# Altium footprint library mainLib.PcbLib: 169 footprints (part 2 of 11)
Each footprint in its own frame and in the unit in brackets; x right, y up, seen from the top. Pads: shape width x height; smd on the part's side, far side on the other; paste and mask are expansions set on the pad; w line width, h text height; cw(c..) or ccw(c..) is an arc to the next point about the centre after c.
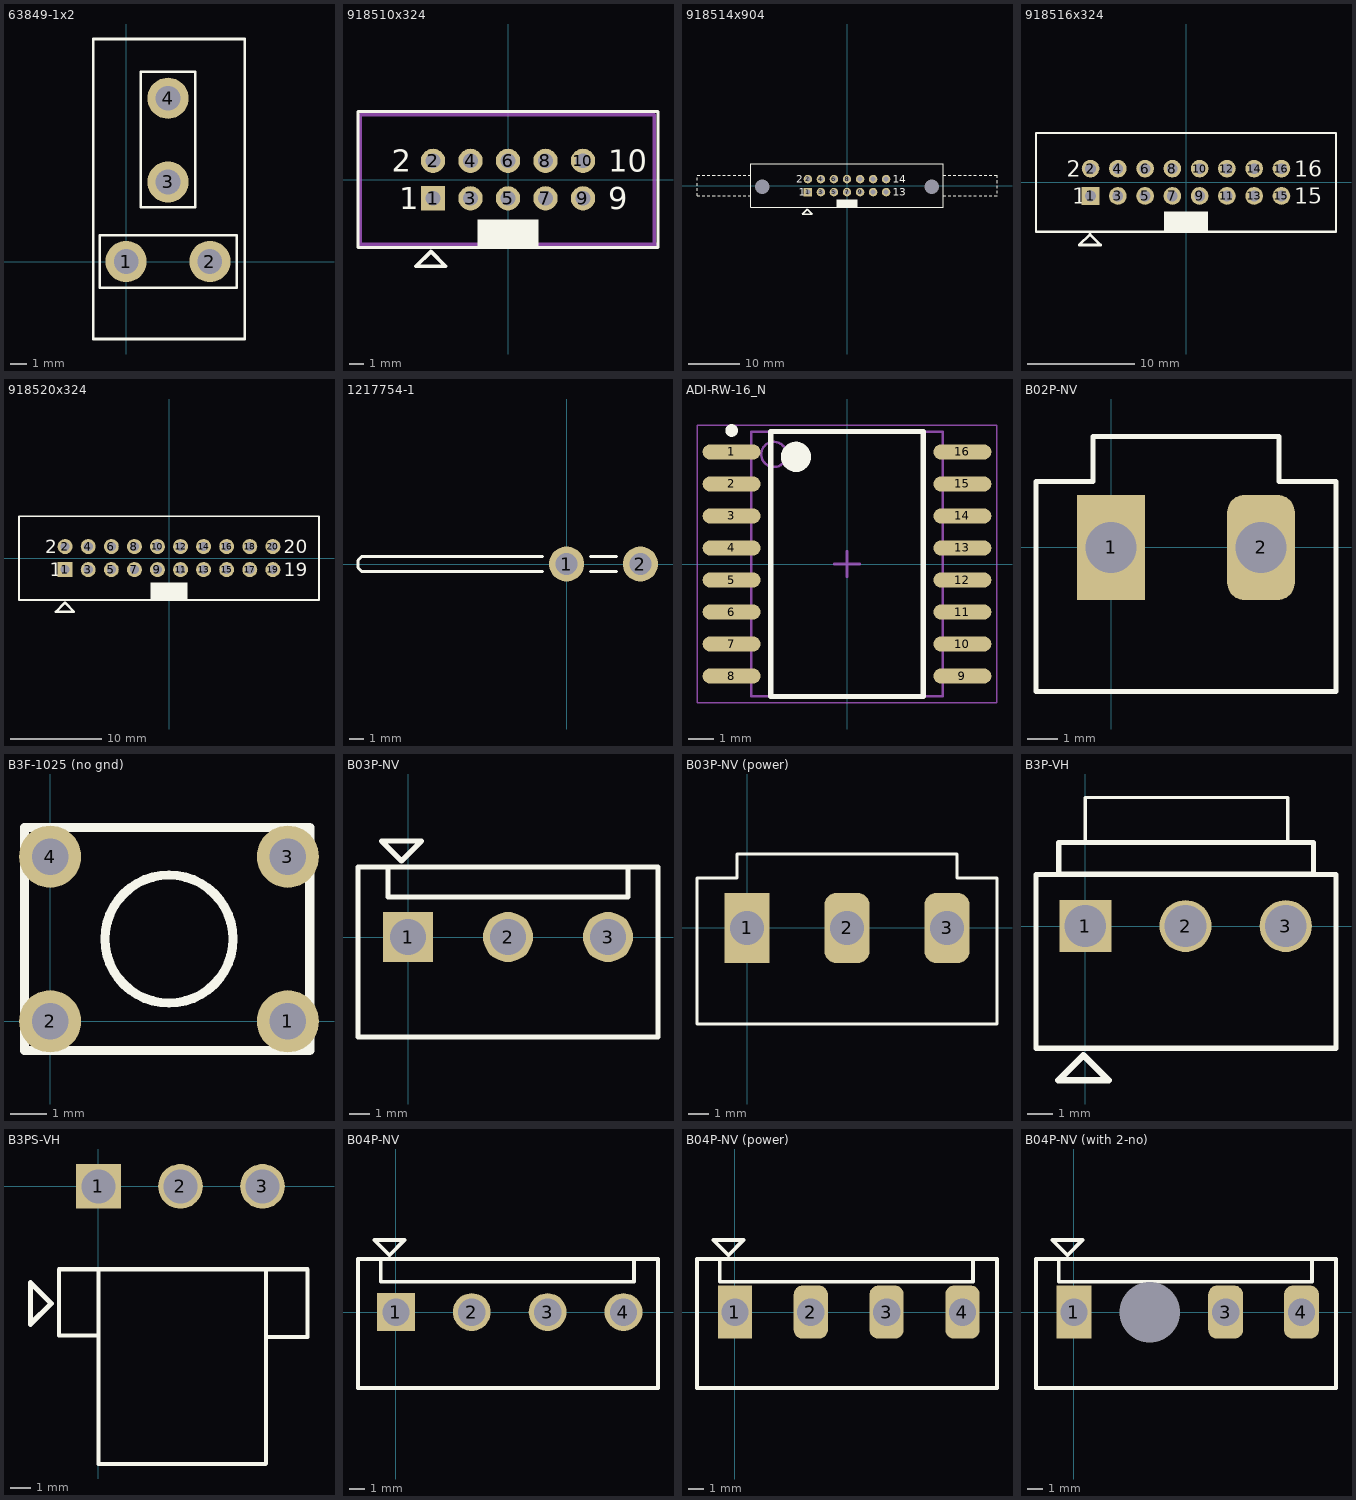
[diagram p1: the footprints below, top view; thin cyan lines are the x and y axes]

## 63849-1x2 [mm]
pads (4):
  round 2.5 hole 1.5: 1(0,0) 2(5.08,0) 3(2.54,4.826) 4(2.54,9.906)
Top Overlay:
  lines w0.152: -2,-4.7 7.2,-4.7 7.2,13.5 -2,13.5 -2,-4.7 ; -1.6,-1.6 -1.6,1.6 6.7,1.6 6.7,-1.6 -1.6,-1.6 ; 0.9,3.3 0.9,11.5 4.2,11.5 4.2,3.3 0.9,3.3
3D body "c-154717-3-at-3d.stp": height 23.31, standoff 1.07, extent -1.143,-2.555 6.222,3.195
3D body "c-154717-3-at-3d.stp": height 23.31, standoff 1.07, extent -0.655,3.654 5.095,11.019
3D body "c-63849-1-k-3d.stp": height 10.22, standoff -3.8, extent -1.422,-1.543 6.503,1.543
3D body "c-63849-1-k-3d.stp": height 10.21, standoff -3.81, extent 0.997,3.404 4.083,11.328
3D body "c-0926522-02-r-3d.stp": height 25.03, standoff 0.9, extent -1.96,-4.705 7.19,13.445

## 918510x324 [mm] "Connector; IDC, Low Profile Male Header, Thru-Hole; 10 Position; Vertical; Pitch 2.54 mm; Body 20.32 x 9.2 x 9.45 mm (LxWxH)"
height 9.45
pads (10):
  rect 1.65x1.65 hole 1: 1(-5.08,-1.27)
  round 1.65 hole 1: 2(-5.08,1.27) 3(-2.54,-1.27) 4(-2.54,1.27) 5(0,-1.27) 6(0,1.27) 7(2.54,-1.27) 8(2.54,1.27) 9(5.08,-1.27) 10(5.08,1.27)
Top Overlay:
  rectangle: -2.05,-4.6 2.05,-2.7
  lines w0.2: -10.16,-4.6 -10.16,4.6 10.16,4.6 10.16,-4.6 -10.16,-4.6
  lines w0.254: -6.225,-5.875 -4.225,-5.875 -5.225,-4.875 -6.225,-5.875
  text "2" at -7.88,0.52 h1.5
  text "1" at -7.38,-2.02 h1.5
  text "10" at 6.78,0.52 h1.5
  text "9" at 6.78,-2.02 h1.5
Mechanical 13:
  lines w0.254: -10,-4.4 -10,4.4 9.9,4.4 9.9,-4.3 10,-4.4 -10,-4.4 ; -10,-4.4 -10,-4.4
3D body "User Library-BH-10___64.step": height 8.84, standoff -3.3, extent -10.18,-4.5 10.18,4.7

## 918514x904 [mm] "Connector; IDC, Thru-Hole; 14 Position; Vertical; Pitch 2.54 mm; Body 37.40 x 8.5 x 25.75 mm (LxWxH), Locking levers"
height 25.75
pads (16):
  rect 1.65x1.65 hole 1: 1(-7.62,-1.27)
  round 1.65 hole 1: 2(-7.62,1.27) 3(-5.08,-1.27) 4(-5.08,1.27) 5(-2.54,-1.27) 6(-2.54,1.27) 7(0,-1.27) 8(0,1.27) 9(2.54,-1.27) 10(2.54,1.27) 11(5.08,-1.27) 12(5.08,1.27) 13(7.62,-1.27) 14(7.62,1.27)
  round 2.5 hole 2.8 unplated: MH1(-16.51,-0.25) MH2(16.51,-0.25)
Top Overlay:
  rectangle: -2.05,-4.25 2.05,-2.7
  lines w0.2: -29.2,-1 -29.2,-0.5 ; -29.2,0 -29.2,0.5 ; -29.2,1 -29.2,1.5 ; -29.2,2 -28.69,2 ; -29.19,-1.5 -29.2,-2 -28.69,-2 ; -28.19,-2 -27.69,-2 ; -28.19,2 -27.69,2 ; -27.19,-2 -26.69,-2 ; -27.19,2 -26.69,2 ; -26.19,-2 -25.69,-2 ; -26.19,2 -25.69,2 ; -25.19,-2 -24.69,-2 ; -25.19,2 -24.69,2 ; -24.19,-2 -23.69,-2 ; -24.19,2 -23.69,2 ; -23.19,-2 -22.69,-2 ; -23.19,2 -22.69,2 ; -22.19,-2 -21.69,-2 ; -22.19,2 -21.69,2 ; -21.19,-2 -20.69,-2 ; -21.19,2 -20.69,2 ; -20.19,-2 -19.69,-2 ; -20.19,2 -19.69,2 ; -19.19,-2 -18.7,-2 ; -19.19,2 -18.7,2 ; 18.7,-2 19.2,-2 ; 18.7,2 19.2,2 ; 19.7,-2 20.2,-2 ; 19.7,2 20.2,2 ; 20.7,-2 21.2,-2 ; 20.7,2 21.2,2 ; 21.7,-2 22.2,-2 ; 21.7,2 22.2,2 ; 22.7,-2 23.2,-2 ; 22.7,2 23.2,2 ; 23.7,-2 24.2,-2 ; 23.7,2 24.2,2 ; 24.7,-2 25.2,-2 ; 24.7,2 25.2,2 ; 25.7,-2 26.2,-2 ; 25.7,2 26.2,2 ; 26.7,-2 27.2,-2 ; 26.7,2 27.2,2 ; 27.7,-2 28.2,-2 ; 27.7,2 28.2,2 ; 28.7,-2 29.2,-2 ; 28.7,2 29.2,2 29.2,1.5 ; 29.2,-1.5 29.2,-1 ; 29.2,-0.5 29.2,0 ; 29.2,0.5 29.2,1 ; -18.7,-4.25 -18.7,4.25 18.7,4.25 18.7,-4.25 -18.7,-4.25
  lines w0.254: -8.75,-5.575 -7.75,-4.575 -6.75,-5.575 -8.75,-5.575
  text "2" at -9.9,0.52 h1.5
  text "1" at -9.4,-2.02 h1.5
  text "14" at 8.9,0.52 h1.5
  text "13" at 8.9,-2.02 h1.5
3D body "091X514X904_100081391MOD000B.STP": height 25.8, standoff -2.85, extent -18.721,-4.258 18.679,4.242

## 918516x324 [mm] "Connector; IDC, Low Profile Male Header, Thru-Hole; 16 Position; Vertical; Pitch 2.54 mm; Body 27.94 x 9.2 x 9.45 mm (LxWxH)"
height 9.45
pads (16):
  rect 1.65x1.65 hole 1: 1(-8.89,-1.27)
  round 1.65 hole 1: 2(-8.89,1.27) 3(-6.35,-1.27) 4(-6.35,1.27) 5(-3.81,-1.27) 6(-3.81,1.27) 7(-1.27,-1.27) 8(-1.27,1.27) 9(1.27,-1.27) 10(1.27,1.27) 11(3.81,-1.27) 12(3.81,1.27) 13(6.35,-1.27) 14(6.35,1.27) 15(8.89,-1.27) 16(8.89,1.27)
Top Overlay:
  rectangle: -2.05,-4.6 2.05,-2.7
  lines w0.2: -13.97,-4.6 13.97,-4.6 13.97,4.6 -13.97,4.6 -13.97,-4.6
  lines w0.254: -9.95,-5.85 -8.95,-4.85 -7.95,-5.85 -9.95,-5.85
  text "15" at 10.09,-2.02 h1.5
  text "16" at 10.09,0.52 h1.5
  text "1" at -10.59,-2.02 h1.5
  text "2" at -11.09,0.52 h1.5
3D body "091X516X324_100081396MOD000B.STP": height 9.46, standoff -2.89, extent -13.95,-4.45 13.95,4.75

## 918520x324 [mm] "Connector; IDC, Low Profile Male Header, Thru-Hole; 20 Position; Vertical; Pitch 2.54 mm; Body 33.02 x 9.2 x 9.45 mm (LxWxH)"
height 9.45
pads (20):
  rect 1.65x1.65 hole 1: 1(-11.43,-1.27)
  round 1.65 hole 1: 2(-11.43,1.27) 3(-8.89,-1.27) 4(-8.89,1.27) 5(-6.35,-1.27) 6(-6.35,1.27) 7(-3.81,-1.27) 8(-3.81,1.27) 9(-1.27,-1.27) 10(-1.27,1.27) 11(1.27,-1.27) 12(1.27,1.27) 13(3.81,-1.27) 14(3.81,1.27) 15(6.35,-1.27) 16(6.35,1.27) 17(8.89,-1.27) 18(8.89,1.27) 19(11.43,-1.27) 20(11.43,1.27)
Top Overlay:
  rectangle: -2.05,-4.6 2.05,-2.7
  lines w0.2: -16.51,-4.6 16.51,-4.6 16.51,4.6 -16.51,4.6 -16.51,-4.6
  lines w0.254: -12.45,-5.9 -11.45,-4.9 -10.45,-5.9 -12.45,-5.9
  text "19" at 12.63,-2.02 h1.5
  text "20" at 12.63,0.52 h1.5
  text "1" at -13.13,-2.02 h1.5
  text "2" at -13.63,0.52 h1.5
3D body "0918_SEK_low_profile_male_header_straight_20-pin_2_9_PCB.stp": height 9.47, standoff -3.18, extent -16.51,-4.45 16.51,4.75

## 1217754-1 [mil]
pads (2):
  round 95 hole 60: 1(0,0) 2(200,0)
Top Overlay:
  lines w8: -65,-20 -555,-20 -565,-10 -565,10 -555,20 -65,20 ; 65,-20 135,-20 ; 65,20 135,20
3D body "c-1217754-1-d-3d.stp": height 351, standoff -149, extent -569,-15.5 231,16

## ADI-RW-16_N [mm] "SOIC, 16-Leads, Body 10.3x7.5mm, Pitch 1.27mm, IPC Medium Density"
height 2.65
pads (16):
  oval 2.3x0.6 smd: 1(-4.575,4.445) 2(-4.575,3.175) 3(-4.575,1.905) 4(-4.575,0.635) 5(-4.575,-0.635) 6(-4.575,-1.905) 7(-4.575,-3.175) 8(-4.575,-4.445) 9(4.575,-4.445) 10(4.575,-3.175) 11(4.575,-1.905) 12(4.575,-0.635) 13(4.575,0.635) 14(4.575,1.905) 15(4.575,3.175) 16(4.575,4.445)
Top Overlay:
  circle w0.25: c-4.575,5.295 r0.125
  circle w0.6: c-2.025,4.25 r0.3
  lines w0.2: -3.025,-5.25 -3.025,5.25 3.025,5.25 3.025,-5.25 -3.025,-5.25
Mechanical 13:
  circle w0.1: c-2.9,4.35 r0.5
  lines w0.1: -3.8,-5.25 -3.8,5.25 3.8,5.25 3.8,-5.25 -3.8,-5.25
Mechanical 15:
  lines w0.05: -5.95,-5.5 -5.95,5.5 5.95,5.5 5.95,-5.5 -5.95,-5.5
  lines w0.1: -0.5,0 0.5,0 ; 0,-0.5 0,0.5
3D body "User Library-SOIC16_Wide_JEDEC_MS-013AA.step": height 2.62, standoff -0.03, extent -5.315,-5.25 5.315,5.25

## B02P-NV [mm]
pads (2):
  rect 2.25x3.5 hole 1.7: 1(0,0)
  rrect50% 2.25x3.5 hole 1.7: 2(5,0)
Top Overlay:
  lines w0.152: -2.5,-4.8 -2.5,2.2 -0.6,2.2 -0.6,3.7 5.6,3.7 5.6,2.2 7.5,2.2 7.5,-4.8 -2.5,-4.8
3D body "B02P-NV.STEP": height 10.92, standoff -3.68, extent -2.5,-4.8 7.5,3.7

## B3F-1025 (no gnd) [mm]
pads (4):
  round 1.7 hole 1: 1(6.5,0) 2(0,0) 3(6.5,4.5) 4(0,4.5)
Top Overlay:
  circle w0.254: c3.25,2.25 r1.75
  lines w0.254: -0.7,-0.8 7.1,-0.8 7.1,5.3 -0.7,5.3 -0.7,-0.8
3D body "b3f-1025.stp": height 5.01, standoff -3.49, extent -0.6,-0.75 7.1,5.25

## B03P-NV [mm]
pads (3):
  rect 2.5x2.5 hole 1.8: 1(0,0)
  round 2.5 hole 1.8: 2(5,0) 3(10,0)
Top Overlay:
  lines w0.254: -1,3.5 -1,2 11,2 11,3.5 ; -2.5,-5 -2.5,3.5 12.5,3.5 12.5,-5 -2.5,-5 ; -1.325,4.8 -0.325,3.8 0.675,4.8 -1.325,4.8
3D body "B03P-NV.STEP": height 10.9, standoff -3.7, extent -2.525,-4.825 12.475,3.675

## B03P-NV (power) [mm]
pads (3):
  rect 2.25x3.5 hole 1.7: 1(0,0)
  rrect50% 2.25x3.5 hole 1.7: 2(5,0) 3(10,0)
Top Overlay:
  lines w0.152: -2.5,-4.8 12.5,-4.8 12.5,2.5 10.5,2.5 10.5,3.7 -0.5,3.7 -0.5,2.5 -2.5,2.5 -2.5,-4.8
3D body "B03P-NV.STEP": height 2.1, standoff -12.5, extent -2.5,-4.8 12.5,3.7

## B3P-VH [mm]
pads (3):
  rect 2.057x2.057 / inner round 0 / far side round 2.057 hole 1.65 mask+0.128: 1(0,0)
  round 2.057 / inner round 0 / far side round 2.057 hole 1.65 mask+0.128: 2(3.96,0) 3(7.92,0)
Top Overlay:
  lines w0.127: 0,3.302 8.001,3.302 8.001,5.08 0,5.08 0,3.302
  lines w0.203: -1.95,-4.826 -1.95,2.032 9.906,2.032 9.906,-4.826 -1.95,-4.826 ; -1.05,2.05 9.017,2.05 9.017,3.302 -1.05,3.302 -1.05,2.05
  lines w0.254: -1.075,-6.1 -0.075,-5.1 0.925,-6.1 -1.075,-6.1
3D body "B3P-VH.STEP": height 10.93, standoff -3.67, extent -1.947,-4.783 9.873,3.717

## B3PS-VH [mm]
pads (3):
  rect 2.158x2.158 / inner round 0 / far side rect 2.158x2.158 hole 1.65 mask+0.128: 1(0,0)
  round 2.158 / inner round 0 / far side round 2.158 hole 1.65 mask+0.128: 2(3.96,0) 3(7.92,0)
Top Overlay:
  lines w0.203: 0,-7.2 -1.9,-7.2 -1.9,-4 10.084,-4 ; 0,-4 0,-13.4 8.063,-13.4 8.09,-13.373 8.09,-4 ; 8.103,-7.264 8.752,-7.264 9.441,-7.264 10.09,-7.264 10.09,-4
  lines w0.254: -3.275,-6.65 -3.275,-4.65 -2.275,-5.65 -3.275,-6.65
3D body "B3PS-VH.STEP": height 8.5, standoff -3.6, extent -1.947,-14.912 9.873,0.558

## B04P-NV [mm]
pads (4):
  rect 2.5x2.5 hole 1.8: 1(0,0)
  round 2.5 hole 1.8: 2(5,0) 3(10,0) 4(15,0)
Top Overlay:
  lines w0.254: -1,3.5 -1,2 15.7,2 15.7,3.5 ; -2.5,-5 17.275,-5 17.275,3.5 -2.5,3.5 -2.5,-5 ; -1.425,4.75 -0.425,3.75 0.575,4.75 -1.425,4.75
3D body "B04P-NV.STEP": height 10.9, standoff -3.7, extent -2.525,-4.825 17.475,3.675

## B04P-NV (power) [mm]
pads (4):
  rect 2.25x3.5 hole 1.8: 1(0,0)
  rrect50% 2.25x3.5 hole 1.8: 2(5,0) 3(10,0) 4(15,0)
Top Overlay:
  lines w0.254: -1,3.5 -1,2 15.7,2 15.7,3.5 ; -2.5,-5 -2.5,3.5 17.275,3.5 17.275,-5 -2.5,-5 ; -1.425,4.75 0.575,4.75 -0.425,3.75 -1.425,4.75
3D body "B04P-NV.STEP": height 10.9, standoff -3.7, extent -2.525,-4.825 17.475,3.675

## B04P-NV (with 2-no) [mm]
pads (4):
  rect 2.3x3.5 hole 1.8: 1(0,0)
  round 0 hole 4: 2(5,0)
  rrect50% 2.3x3.5 hole 1.8: 3(10,0) 4(15,0)
Top Overlay:
  lines w0.254: -1,3.5 -1,2 15.7,2 15.7,3.5 ; -2.5,-5 -2.5,3.5 17.275,3.5 17.275,-5 -2.5,-5 ; -1.425,4.75 0.575,4.75 -0.425,3.75 -1.425,4.75
3D body "B04P-NV.STEP": height 10.9, standoff -3.7, extent -2.525,-4.825 17.475,3.675